# Altium integrated library WE_WR-WTB_Wire-to-Board Connectors_2.54 mm_rev16a.IntLib: 58 symbols
Pins are listed as number, name and electrical type; pins without a type are passive.

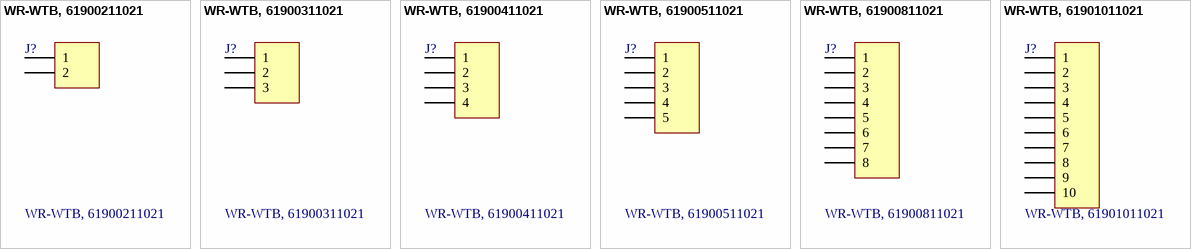
[diagram p0: symbols WR-WTB, 61900211021 to WR-WTB, 61901011021]

## WR-WTB, 61900211021
designator J?
WR-WTB 2.54mm Male Left Angeled Locking Header; Manufacturer: Würth Elektronik eiSos GmbH; ComponentLink1 Description: Manufacturer; ComponentLink2 Description: Datasheet; NoPins: 2; Created Date: 17 May 2013; partNo: 61900211021; ComponentLink1URL: http://www.we-online.com; ComponentLink2URL: http://katalog.we-online.de/em/datasheet/6190xx11021.pdf; Created by: Karrer Zheng
footprint 61900211021 (2 pins, left angeled)
pins: 1, 2

## WR-WTB, 61900311021
designator J?
WR-WTB 2.54mm Male Left Angeled Locking Header; Manufacturer: Würth Elektronik eiSos GmbH; ComponentLink1 Description: Manufacturer; ComponentLink2 Description: Datasheet; NoPins: 3; Created Date: 17 May 2013; partNo: 61900311021; ComponentLink1URL: http://www.we-online.com; ComponentLink2URL: http://katalog.we-online.de/em/datasheet/6190xx11021.pdf; Created by: Karrer Zheng
footprint 61900311021 (3 pins, left angeled)
pins: 1, 2, 3

## WR-WTB, 61900411021
designator J?
WR-WTB 2.54mm Male Left Angeled Locking Header; Manufacturer: Würth Elektronik eiSos GmbH; ComponentLink1 Description: Manufacturer; ComponentLink2 Description: Datasheet; NoPins: 4; Created Date: 17 May 2013; partNo: 61900411021; ComponentLink1URL: http://www.we-online.com; ComponentLink2URL: http://katalog.we-online.de/em/datasheet/6190xx11021.pdf; Created by: Karrer Zheng
footprint 61900411021 (4 pins, left angeled)
pins: 1, 2, 3, 4

## WR-WTB, 61900511021
designator J?
WR-WTB 2.54mm Male Left Angeled Locking Header; Manufacturer: Würth Elektronik eiSos GmbH; ComponentLink1 Description: Manufacturer; ComponentLink2 Description: Datasheet; NoPins: 5; Created Date: 17 May 2013; partNo: 61900511021; ComponentLink1URL: http://www.we-online.com; ComponentLink2URL: http://katalog.we-online.de/em/datasheet/6190xx11021.pdf; Created by: Karrer Zheng
footprint 61900511021 (5 pins, left angeled)
pins: 1, 2, 3, 4, 5

## WR-WTB, 61900811021
designator J?
WR-WTB 2.54mm Male Left Angeled Locking Header; Manufacturer: Würth Elektronik eiSos GmbH; ComponentLink1 Description: Manufacturer; ComponentLink2 Description: Datasheet; NoPins: 8; Created Date: 17 May 2013; partNo: 61900811021; ComponentLink1URL: http://www.we-online.com; ComponentLink2URL: http://katalog.we-online.de/em/datasheet/6190xx11021.pdf; Created by: Karrer Zheng
footprint 61900811021 (8 pins, left angeled)
pins: 1, 2, 3, 4, 5, 6, 7, 8

## WR-WTB, 61901011021
designator J?
WR-WTB 2.54mm Male Left Angeled Locking Header; Manufacturer: Würth Elektronik eiSos GmbH; ComponentLink1 Description: Manufacturer; ComponentLink2 Description: Datasheet; NoPins: 10; Created Date: 17 May 2013; partNo: 61901011021; ComponentLink1URL: http://www.we-online.com; ComponentLink2URL: http://katalog.we-online.de/em/datasheet/6190xx11021.pdf; Created by: Karrer Zheng
footprint 61901011021 (10 pins, left angeled)
pins: 1, 2, 3, 4, 5, 6, 7, 8, 9, 10


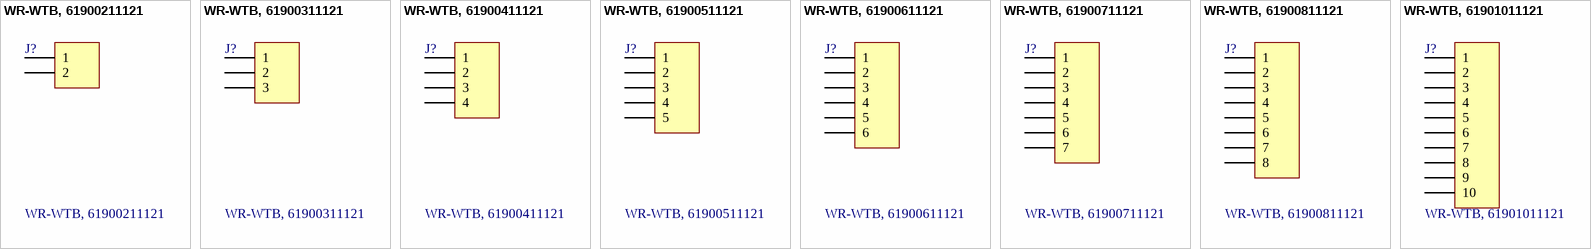
[diagram p1: symbols WR-WTB, 61900211121 to WR-WTB, 61901011121]

## WR-WTB, 61900211121
designator J?
WR-WTB 2.54mm Male Locking Header; Manufacturer: Würth Elektronik eiSos GmbH; ComponentLink1 Description: Manufacturer; ComponentLink2 Description: Datasheet; NoPins: 2; Created Date: 16 May 2013; partNo: 61900211121; ComponentLink1URL: http://www.we-online.com; ComponentLink2URL: http://katalog.we-online.de/em/datasheet/6190xx11121.pdf; Created by: Karrer Zheng
footprint 61900211121 (2 pins, straight)
pins: 1, 2

## WR-WTB, 61900311121
designator J?
WR-WTB 2.54mm Male Locking Header; Manufacturer: Würth Elektronik eiSos GmbH; ComponentLink1 Description: Manufacturer; ComponentLink2 Description: Datasheet; NoPins: 3; Created Date: 16 May 2013; partNo: 61900311121; ComponentLink1URL: http://www.we-online.com; ComponentLink2URL: http://katalog.we-online.de/em/datasheet/6190xx11121.pdf; Created by: Karrer Zheng
footprint 61900311121 (3 pins, straight)
pins: 1, 2, 3

## WR-WTB, 61900411121
designator J?
WR-WTB 2.54mm Male Locking Header; Manufacturer: Würth Elektronik eiSos GmbH; ComponentLink1 Description: Manufacturer; ComponentLink2 Description: Datasheet; NoPins: 4; Created Date: 16 May 2013; partNo: 61900411121; ComponentLink1URL: http://www.we-online.com; ComponentLink2URL: http://katalog.we-online.de/em/datasheet/6190xx11121.pdf; Created by: Karrer Zheng
footprint 61900411121 (4 pins, straight)
pins: 1, 2, 3, 4

## WR-WTB, 61900511121
designator J?
WR-WTB 2.54mm Male Locking Header; Manufacturer: Würth Elektronik eiSos GmbH; ComponentLink1 Description: Manufacturer; ComponentLink2 Description: Datasheet; NoPins: 5; Created Date: 16 May 2013; partNo: 61900511121; ComponentLink1URL: http://www.we-online.com; ComponentLink2URL: http://katalog.we-online.de/em/datasheet/6190xx11121.pdf; Created by: Karrer Zheng
footprint 61900511121 (5 pins, straight)
pins: 1, 2, 3, 4, 5

## WR-WTB, 61900611121
designator J?
WR-WTB 2.54mm Male Locking Header; Manufacturer: Würth Elektronik eiSos GmbH; ComponentLink1 Description: Manufacturer; ComponentLink2 Description: Datasheet; NoPins: 6; Created Date: 16 May 2013; partNo: 61900611121; ComponentLink1URL: http://www.we-online.com; ComponentLink2URL: http://katalog.we-online.de/em/datasheet/6190xx11121.pdf; Created by: Karrer Zheng
footprint 61900611121 (6 pins, straight)
pins: 1, 2, 3, 4, 5, 6

## WR-WTB, 61900711121
designator J?
WR-WTB 2.54mm Male Locking Header; Manufacturer: Würth Elektronik eiSos GmbH; ComponentLink1 Description: Manufacturer; ComponentLink2 Description: Datasheet; NoPins: 7; Created Date: 16 May 2013; partNo: 61900711121; ComponentLink1URL: http://www.we-online.com; ComponentLink2URL: http://katalog.we-online.de/em/datasheet/6190xx11121.pdf; Created by: Karrer Zheng
footprint 61900711121 (7 pins, straight)
pins: 1, 2, 3, 4, 5, 6, 7

## WR-WTB, 61900811121
designator J?
WR-WTB 2.54mm Male Locking Header; Manufacturer: Würth Elektronik eiSos GmbH; ComponentLink1 Description: Manufacturer; ComponentLink2 Description: Datasheet; NoPins: 8; Created Date: 16 May 2013; partNo: 61900811121; ComponentLink1URL: http://www.we-online.com; ComponentLink2URL: http://katalog.we-online.de/em/datasheet/6190xx11121.pdf; Created by: Karrer Zheng
footprint 61900811121 (8 pins, straight)
pins: 1, 2, 3, 4, 5, 6, 7, 8

## WR-WTB, 61901011121
designator J?
WR-WTB 2.54mm Male Locking Header; Manufacturer: Würth Elektronik eiSos GmbH; ComponentLink1 Description: Manufacturer; ComponentLink2 Description: Datasheet; NoPins: 10; Created Date: 16 May 2013; partNo: 61901011121; ComponentLink1URL: http://www.we-online.com; ComponentLink2URL: http://katalog.we-online.de/em/datasheet/6190xx11121.pdf; Created by: Karrer Zheng
footprint 61901011121 (10 pins, straight)
pins: 1, 2, 3, 4, 5, 6, 7, 8, 9, 10


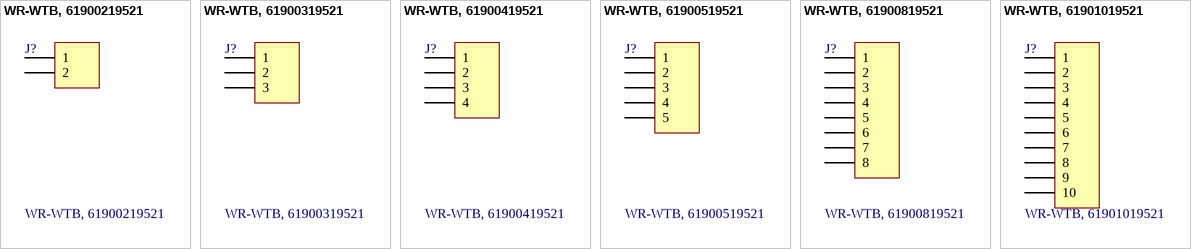
[diagram p2: symbols WR-WTB, 61900219521 to WR-WTB, 61901019521]

## WR-WTB, 61900219521
designator J?
WERI Wire to board 2,54; Manufacturer: Würth Elektronik eiSos GmbH; ComponentLink1 Description: Manufacturer; ComponentLink2 Description: Datasheet; NoPins: 2; Created Date: 17 May 2013; partNo: 61900219521; ComponentLink1URL: http://www.we-online.com; ComponentLink2URL: http://katalog.we-online.de/em/datasheet/6190xx19521.pdf; Created by: Karrer Zheng
footprint 61900219521 (M RA 2p 1 row left)
pins: 1, 2

## WR-WTB, 61900319521
designator J?
WERI Wire to board 2,54; Manufacturer: Würth Elektronik eiSos GmbH; ComponentLink1 Description: Manufacturer; ComponentLink2 Description: Datasheet; NoPins: 3; Created Date: 17 May 2013; partNo: 61900319521; ComponentLink1URL: http://www.we-online.com; ComponentLink2URL: http://katalog.we-online.de/em/datasheet/6190xx19521.pdf; Created by: Karrer Zheng
footprint 61900319521 (M RA 3p 1 row left)
pins: 1, 2, 3

## WR-WTB, 61900419521
designator J?
WERI Wire to board 2,54; Manufacturer: Würth Elektronik eiSos GmbH; ComponentLink1 Description: Manufacturer; ComponentLink2 Description: Datasheet; NoPins: 4; Created Date: 17 May 2013; partNo: 61900419521; ComponentLink1URL: http://www.we-online.com; ComponentLink2URL: http://katalog.we-online.de/em/datasheet/6190xx19521.pdf; Created by: Karrer Zheng
footprint 61900419521 (M RA 4p 1 row left)
pins: 1, 2, 3, 4

## WR-WTB, 61900519521
designator J?
WERI Wire to board 2,54; Manufacturer: Würth Elektronik eiSos GmbH; ComponentLink1 Description: Manufacturer; ComponentLink2 Description: Datasheet; NoPins: 5; Created Date: 17 May 2013; partNo: 61900519521; ComponentLink1URL: http://www.we-online.com; ComponentLink2URL: http://katalog.we-online.de/em/datasheet/6190xx19521.pdf; Created by: Karrer Zheng
footprint 61900519521 (M RA 5p 1 row left)
pins: 1, 2, 3, 4, 5

## WR-WTB, 61900819521
designator J?
WERI Wire to board 2,54; Manufacturer: Würth Elektronik eiSos GmbH; ComponentLink1 Description: Manufacturer; ComponentLink2 Description: Datasheet; NoPins: 8; Created Date: 17 May 2013; partNo: 61900819521; ComponentLink1URL: http://www.we-online.com; ComponentLink2URL: http://katalog.we-online.de/em/datasheet/6190xx19521.pdf; Created by: Karrer Zheng
footprint 61900819521 (M RA 8p 1 row left)
pins: 1, 2, 3, 4, 5, 6, 7, 8

## WR-WTB, 61901019521
designator J?
WERI Wire to board 2,54; Manufacturer: Würth Elektronik eiSos GmbH; ComponentLink1 Description: Manufacturer; ComponentLink2 Description: Datasheet; NoPins: 10; Created Date: 17 May 2013; partNo: 61901019521; ComponentLink1URL: http://www.we-online.com; ComponentLink2URL: http://katalog.we-online.de/em/datasheet/6190xx19521.pdf; Created by: Karrer Zheng
footprint 61901019521 (M RA 10p 1 row left)
pins: 1, 2, 3, 4, 5, 6, 7, 8, 9, 10


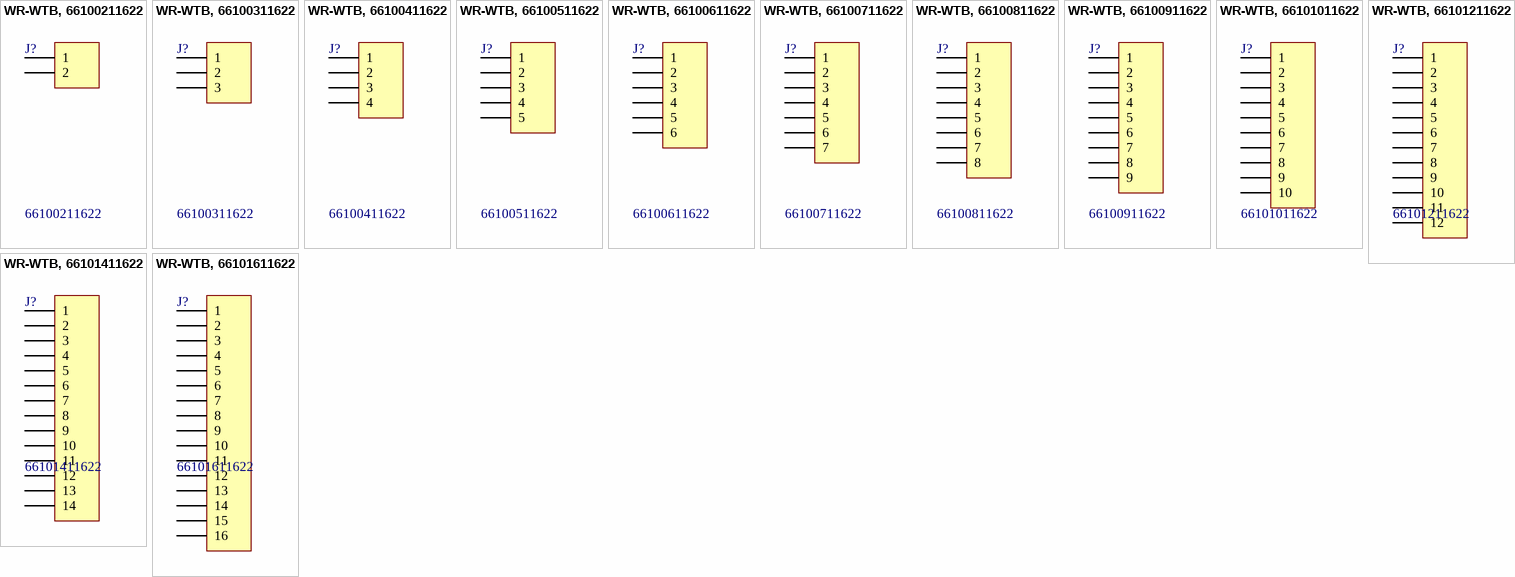
[diagram p3: symbols WR-WTB, 66100211622 to WR-WTB, 66101611622]

## WR-WTB, 66100211622
designator J?, comment 66100211622
WR-WTB 2.54mm Shrouded Header_Straight; Manufacturer: Wurth Elektronik; ComponentLink1 Description: Manufacturer; ComponentLink2 Description: Datasheet; NoPins: 2; Created Date: 21.Sep.2015; partNo: 66100211622; ComponentLink1URL: http://www.we-online.com; ComponentLink2URL: http://katalog.we-online.de/em/datasheet/6610XX11622.pdf; Created by: Baojun Chen
footprint 66100211622 (2 pins, Straight)
pins: 1, 2

## WR-WTB, 66100311622
designator J?, comment 66100311622
WR-WTB 2.54mm Shrouded Header_Straight; Manufacturer: Wurth Elektronik; ComponentLink1 Description: Manufacturer; ComponentLink2 Description: Datasheet; NoPins: 3; Created Date: 21.Sep.2015; partNo: 66100311622; ComponentLink1URL: http://www.we-online.com; ComponentLink2URL: http://katalog.we-online.de/em/datasheet/6610XX11622.pdf; Created by: Baojun Chen
footprint 66100311622 (3 pins, Straight)
pins: 1, 2, 3

## WR-WTB, 66100411622
designator J?, comment 66100411622
WR-WTB 2.54mm Shrouded Header_Straight; Manufacturer: Wurth Elektronik; ComponentLink1 Description: Manufacturer; ComponentLink2 Description: Datasheet; NoPins: 4; Created Date: 21.Sep.2015; partNo: 66100411622; ComponentLink1URL: http://www.we-online.com; ComponentLink2URL: http://katalog.we-online.de/em/datasheet/6610XX11622.pdf; Created by: Baojun Chen
footprint 66100411622 (4 pins, Straight)
pins: 1, 2, 3, 4

## WR-WTB, 66100511622
designator J?, comment 66100511622
WR-WTB 2.54mm Shrouded Header_Straight; Manufacturer: Wurth Elektronik; ComponentLink1 Description: Manufacturer; ComponentLink2 Description: Datasheet; NoPins: 5; Created Date: 21.Sep.2015; partNo: 66100511622; ComponentLink1URL: http://www.we-online.com; ComponentLink2URL: http://katalog.we-online.de/em/datasheet/6610XX11622.pdf; Created by: Baojun Chen
footprint 66100511622 (5 pins, Straight)
pins: 1, 2, 3, 4, 5

## WR-WTB, 66100611622
designator J?, comment 66100611622
WR-WTB 2.54mm Shrouded Header_Straight; Manufacturer: Wurth Elektronik; ComponentLink1 Description: Manufacturer; ComponentLink2 Description: Datasheet; NoPins: 6; Created Date: 21.Sep.2015; partNo: 66100611622; ComponentLink1URL: http://www.we-online.com; ComponentLink2URL: http://katalog.we-online.de/em/datasheet/6610XX11622.pdf; Created by: Baojun Chen
footprint 66100611622 (6 pins, Straight)
pins: 1, 2, 3, 4, 5, 6

## WR-WTB, 66100711622
designator J?, comment 66100711622
WR-WTB 2.54mm Shrouded Header_Straight; Manufacturer: Wurth Elektronik; ComponentLink1 Description: Manufacturer; ComponentLink2 Description: Datasheet; NoPins: 7; Created Date: 21.Sep.2015; partNo: 66100711622; ComponentLink1URL: http://www.we-online.com; ComponentLink2URL: http://katalog.we-online.de/em/datasheet/6610XX11622.pdf; Created by: Baojun Chen
footprint 66100711622 (7 pins, Straight)
pins: 1, 2, 3, 4, 5, 6, 7

## WR-WTB, 66100811622
designator J?, comment 66100811622
WR-WTB 2.54mm Shrouded Header_Straight; Manufacturer: Wurth Elektronik; ComponentLink1 Description: Manufacturer; ComponentLink2 Description: Datasheet; NoPins: 8; Created Date: 21.Sep.2015; partNo: 66100811622; ComponentLink1URL: http://www.we-online.com; ComponentLink2URL: http://katalog.we-online.de/em/datasheet/6610XX11622.pdf; Created by: Baojun Chen
footprint 66100811622 (8 pins, Straight)
pins: 1, 2, 3, 4, 5, 6, 7, 8

## WR-WTB, 66100911622
designator J?, comment 66100911622
WR-WTB 2.54mm Shrouded Header_Straight; Manufacturer: Wurth Elektronik; ComponentLink1 Description: Manufacturer; ComponentLink2 Description: Datasheet; NoPins: 9; Created Date: 21.Sep.2015; partNo: 66100911622; ComponentLink1URL: http://www.we-online.com; ComponentLink2URL: http://katalog.we-online.de/em/datasheet/6610XX11622.pdf; Created by: Baojun Chen
footprint 66100911622 (9 pins, Straight)
pins: 1, 2, 3, 4, 5, 6, 7, 8, 9

## WR-WTB, 66101011622
designator J?, comment 66101011622
WR-WTB 2.54mm Shrouded Header_Straight; Manufacturer: Wurth Elektronik; ComponentLink1 Description: Manufacturer; ComponentLink2 Description: Datasheet; NoPins: 10; Created Date: 21.Sep.2015; partNo: 66101011622; ComponentLink1URL: http://www.we-online.com; ComponentLink2URL: http://katalog.we-online.de/em/datasheet/6610XX11622.pdf; Created by: Baojun Chen
footprint 66101011622 (10 pins, Straight)
pins: 1, 2, 3, 4, 5, 6, 7, 8, 9, 10

## WR-WTB, 66101211622
designator J?, comment 66101211622
WR-WTB 2.54mm Shrouded Header_Straight; Manufacturer: Wurth Elektronik; ComponentLink1 Description: Manufacturer; ComponentLink2 Description: Datasheet; NoPins: 12; Created Date: 21.Sep.2015; partNo: 66101211622; ComponentLink1URL: http://www.we-online.com; ComponentLink2URL: http://katalog.we-online.de/em/datasheet/6610XX11622.pdf; Created by: Baojun Chen
footprint 66101211622 (12 pins, Straight)
pins: 1, 2, 3, 4, 5, 6, 7, 8, 9, 10, 11, 12

## WR-WTB, 66101411622
designator J?, comment 66101411622
WR-WTB 2.54mm Shrouded Header_Straight; Manufacturer: Wurth Elektronik; ComponentLink1 Description: Manufacturer; ComponentLink2 Description: Datasheet; NoPins: 14; Created Date: 21.Sep.2015; partNo: 66101411622; ComponentLink1URL: http://www.we-online.com; ComponentLink2URL: http://katalog.we-online.de/em/datasheet/6610XX11622.pdf; Created by: Baojun Chen
footprint 66101411622 (14 pins, Straight)
pins: 1, 2, 3, 4, 5, 6, 7, 8, 9, 10, 11, 12, 13, 14

## WR-WTB, 66101611622
designator J?, comment 66101611622
WR-WTB 2.54mm Shrouded Header_Straight; Manufacturer: Wurth Elektronik; ComponentLink1 Description: Manufacturer; ComponentLink2 Description: Datasheet; NoPins: 16; Created Date: 21.Sep.2015; partNo: 66101611622; ComponentLink1URL: http://www.we-online.com; ComponentLink2URL: http://katalog.we-online.de/em/datasheet/6610XX11622.pdf; Created by: Baojun Chen
footprint 66101611622 (16 pins, Straight)
pins: 1, 2, 3, 4, 5, 6, 7, 8, 9, 10, 11, 12, 13, 14, 15, 16


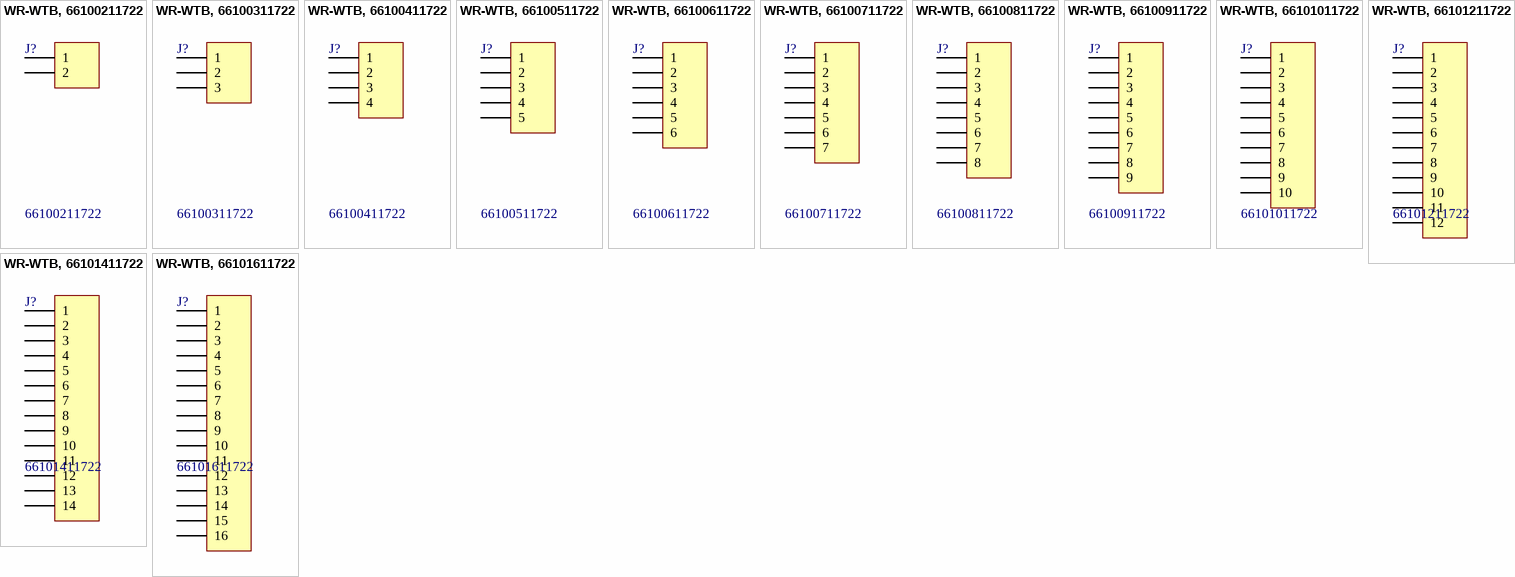
[diagram p4: symbols WR-WTB, 66100211722 to WR-WTB, 66101611722]

## WR-WTB, 66100211722
designator J?, comment 66100211722
WR-WTB 2.54mm Shrouded Header_Right Angle; Manufacturer: Wurth Elektronik; ComponentLink1 Description: Manufacturer; ComponentLink2 Description: Datasheet; NoPins: 2; Created Date: 9.Oct.2015; partNo: 66100211722; ComponentLink1URL: http://www.we-online.com; ComponentLink2URL: http://katalog.we-online.de/en/em/WTB_2_54_MALE_VERTICAL_SHROUDED_HEADER_GLOW_WIRE_PLASTIC_6610XXX1722; Created by: Baojun Chen
footprint 66100211722 (2 pins, Right Angle)
pins: 1, 2

## WR-WTB, 66100311722
designator J?, comment 66100311722
WR-WTB 2.54mm Shrouded Header_Right Angle; Manufacturer: Wurth Elektronik; ComponentLink1 Description: Manufacturer; ComponentLink2 Description: Datasheet; NoPins: 3; Created Date: 9.Oct.2015; partNo: 66100311722; ComponentLink1URL: http://www.we-online.com; ComponentLink2URL: http://katalog.we-online.de/en/em/WTB_2_54_MALE_VERTICAL_SHROUDED_HEADER_GLOW_WIRE_PLASTIC_6610XXX1722; Created by: Baojun Chen
footprint 66100311722 (3 pins, Right Angle)
pins: 1, 2, 3

## WR-WTB, 66100411722
designator J?, comment 66100411722
WR-WTB 2.54mm Shrouded Header_Right Angle; Manufacturer: Wurth Elektronik; ComponentLink1 Description: Manufacturer; ComponentLink2 Description: Datasheet; NoPins: 4; Created Date: 9.Oct.2015; partNo: 66100411722; ComponentLink1URL: http://www.we-online.com; ComponentLink2URL: http://katalog.we-online.de/en/em/WTB_2_54_MALE_VERTICAL_SHROUDED_HEADER_GLOW_WIRE_PLASTIC_6610XXX1722; Created by: Baojun Chen
footprint 66100411722 (4 pins, Right Angle)
pins: 1, 2, 3, 4

## WR-WTB, 66100511722
designator J?, comment 66100511722
WR-WTB 2.54mm Shrouded Header_Right Angle; Manufacturer: Wurth Elektronik; ComponentLink1 Description: Manufacturer; ComponentLink2 Description: Datasheet; NoPins: 5; Created Date: 9.Oct.2015; partNo: 66100511722; ComponentLink1URL: http://www.we-online.com; ComponentLink2URL: http://katalog.we-online.de/en/em/WTB_2_54_MALE_VERTICAL_SHROUDED_HEADER_GLOW_WIRE_PLASTIC_6610XXX1722; Created by: Baojun Chen
footprint 66100511722 (5 pins, Right Angle)
pins: 1, 2, 3, 4, 5

## WR-WTB, 66100611722
designator J?, comment 66100611722
WR-WTB 2.54mm Shrouded Header_Right Angle; Manufacturer: Wurth Elektronik; ComponentLink1 Description: Manufacturer; ComponentLink2 Description: Datasheet; NoPins: 6; Created Date: 9.Oct.2015; partNo: 66100611722; ComponentLink1URL: http://www.we-online.com; ComponentLink2URL: http://katalog.we-online.de/en/em/WTB_2_54_MALE_VERTICAL_SHROUDED_HEADER_GLOW_WIRE_PLASTIC_6610XXX1722; Created by: Baojun Chen
footprint 66100611722 (6 pins, Right Angle)
pins: 1, 2, 3, 4, 5, 6

## WR-WTB, 66100711722
designator J?, comment 66100711722
WR-WTB 2.54mm Shrouded Header_Right Angle; Manufacturer: Wurth Elektronik; ComponentLink1 Description: Manufacturer; ComponentLink2 Description: Datasheet; NoPins: 7; Created Date: 9.Oct.2015; partNo: 66100711722; ComponentLink1URL: http://www.we-online.com; ComponentLink2URL: http://katalog.we-online.de/en/em/WTB_2_54_MALE_VERTICAL_SHROUDED_HEADER_GLOW_WIRE_PLASTIC_6610XXX1722; Created by: Baojun Chen
footprint 66100711722 (7 pins, Right Angle)
pins: 1, 2, 3, 4, 5, 6, 7

## WR-WTB, 66100811722
designator J?, comment 66100811722
WR-WTB 2.54mm Shrouded Header_Right Angle; Manufacturer: Wurth Elektronik; ComponentLink1 Description: Manufacturer; ComponentLink2 Description: Datasheet; NoPins: 8; Created Date: 9.Oct.2015; partNo: 66100811722; ComponentLink1URL: http://www.we-online.com; ComponentLink2URL: http://katalog.we-online.de/en/em/WTB_2_54_MALE_VERTICAL_SHROUDED_HEADER_GLOW_WIRE_PLASTIC_6610XXX1722; Created by: Baojun Chen
footprint 66100811722 (8 pins, Right Angle)
pins: 1, 2, 3, 4, 5, 6, 7, 8

## WR-WTB, 66100911722
designator J?, comment 66100911722
WR-WTB 2.54mm Shrouded Header_Right Angle; Manufacturer: Wurth Elektronik; ComponentLink1 Description: Manufacturer; ComponentLink2 Description: Datasheet; NoPins: 9; Created Date: 9.Oct.2015; partNo: 66100911722; ComponentLink1URL: http://www.we-online.com; ComponentLink2URL: http://katalog.we-online.de/en/em/WTB_2_54_MALE_VERTICAL_SHROUDED_HEADER_GLOW_WIRE_PLASTIC_6610XXX1722; Created by: Baojun Chen
footprint 66100911722 (9 pins, Right Angle)
pins: 1, 2, 3, 4, 5, 6, 7, 8, 9

## WR-WTB, 66101011722
designator J?, comment 66101011722
WR-WTB 2.54mm Shrouded Header_Right Angle; Manufacturer: Wurth Elektronik; ComponentLink1 Description: Manufacturer; ComponentLink2 Description: Datasheet; NoPins: 10; Created Date: 9.Oct.2015; partNo: 66101011722; ComponentLink1URL: http://www.we-online.com; ComponentLink2URL: http://katalog.we-online.de/en/em/WTB_2_54_MALE_VERTICAL_SHROUDED_HEADER_GLOW_WIRE_PLASTIC_6610XXX1722; Created by: Baojun Chen
footprint 66101011722 (10 pins, Right Angle)
pins: 1, 2, 3, 4, 5, 6, 7, 8, 9, 10

## WR-WTB, 66101211722
designator J?, comment 66101211722
WR-WTB 2.54mm Shrouded Header_Right Angle; Manufacturer: Wurth Elektronik; ComponentLink1 Description: Manufacturer; ComponentLink2 Description: Datasheet; NoPins: 12; Created Date: 9.Oct.2015; partNo: 66101211722; ComponentLink1URL: http://www.we-online.com; ComponentLink2URL: http://katalog.we-online.de/en/em/WTB_2_54_MALE_VERTICAL_SHROUDED_HEADER_GLOW_WIRE_PLASTIC_6610XXX1722; Created by: Baojun Chen
footprint 66101211722 (12 pins, Right Angle)
pins: 1, 2, 3, 4, 5, 6, 7, 8, 9, 10, 11, 12

## WR-WTB, 66101411722
designator J?, comment 66101411722
WR-WTB 2.54mm Shrouded Header_Right Angle; Manufacturer: Wurth Elektronik; ComponentLink1 Description: Manufacturer; ComponentLink2 Description: Datasheet; NoPins: 14; Created Date: 9.Oct.2015; partNo: 66101411722; ComponentLink1URL: http://www.we-online.com; ComponentLink2URL: http://katalog.we-online.de/en/em/WTB_2_54_MALE_VERTICAL_SHROUDED_HEADER_GLOW_WIRE_PLASTIC_6610XXX1722; Created by: Baojun Chen
footprint 66101411722 (14 pins, Right Angle)
pins: 1, 2, 3, 4, 5, 6, 7, 8, 9, 10, 11, 12, 13, 14

## WR-WTB, 66101611722
designator J?, comment 66101611722
WR-WTB 2.54mm Shrouded Header_Right Angle; Manufacturer: Wurth Elektronik; ComponentLink1 Description: Manufacturer; ComponentLink2 Description: Datasheet; NoPins: 16; Created Date: Dec.2015; partNo: 66101611722; ComponentLink1URL: http://www.we-online.com; ComponentLink2URL: http://katalog.we-online.de/en/em/WTB_2_54_MALE_VERTICAL_SHROUDED_HEADER_GLOW_WIRE_PLASTIC_6610XXX1722; Created by: Baojun Chen
footprint 66101611722 (16 pins, Right Angle)
pins: 1, 2, 3, 4, 5, 6, 7, 8, 9, 10, 11, 12, 13, 14, 15, 16


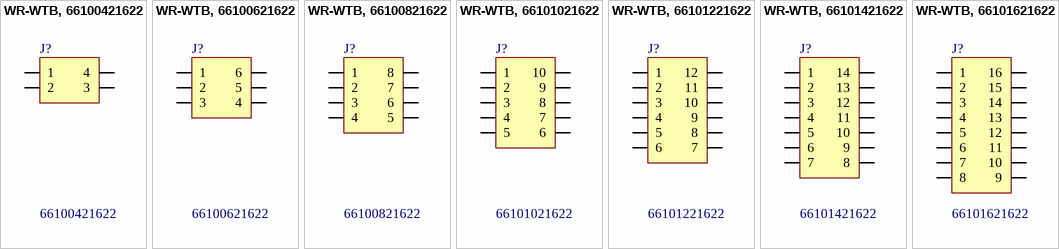
[diagram p5: symbols WR-WTB, 66100421622 to WR-WTB, 66101621622]

## WR-WTB, 66100421622
designator J?, comment 66100421622
WR-WTB 2.54mm Shrouded Header_Straight; Manufacturer: Wurth Elektronik; ComponentLink1 Description: Manufacturer; ComponentLink2 Description: Datasheet; NoPins: 4; Created Date: 9.Oct.2015; partNo: 66100421622; ComponentLink1URL: http://www.we-online.com; ComponentLink2URL: http://katalog.we-online.de/em/datasheet/6610XX11622.pdf; Created by: Baojun Chen
footprint 66100421622 (4 pins)
pins: 1, 2, 3, 4

## WR-WTB, 66100621622
designator J?, comment 66100621622
WR-WTB 2.54mm Shrouded Header_Straight; Manufacturer: Wurth Elektronik; ComponentLink1 Description: Manufacturer; ComponentLink2 Description: Datasheet; NoPins: 6; Created Date: 9.Oct.2015; partNo: 66100621622; ComponentLink1URL: http://www.we-online.com; ComponentLink2URL: http://katalog.we-online.de/em/datasheet/6610XX11622.pdf; Created by: Baojun Chen
footprint 66100621622 (6 pins)
pins: 1, 2, 3, 4, 5, 6

## WR-WTB, 66100821622
designator J?, comment 66100821622
WR-WTB 2.54mm Shrouded Header_Straight; Manufacturer: Wurth Elektronik; ComponentLink1 Description: Manufacturer; ComponentLink2 Description: Datasheet; NoPins: 8; Created Date: 9.Oct.2015; partNo: 66100821622; ComponentLink1URL: http://www.we-online.com; ComponentLink2URL: http://katalog.we-online.de/em/datasheet/6610XX11622.pdf; Created by: Baojun Chen
footprint 66100821622 (8 pins)
pins: 1, 2, 3, 4, 5, 6, 7, 8

## WR-WTB, 66101021622
designator J?, comment 66101021622
WR-WTB 2.54mm Shrouded Header_Straight; Manufacturer: Wurth Elektronik; ComponentLink1 Description: Manufacturer; ComponentLink2 Description: Datasheet; NoPins: 10; Created Date: 9.Oct.2015; partNo: 66101021622; ComponentLink1URL: http://www.we-online.com; ComponentLink2URL: http://katalog.we-online.de/em/datasheet/6610XX11622.pdf; Created by: Baojun Chen
footprint 66101021622 (10 pins)
pins: 1, 2, 3, 4, 5, 6, 7, 8, 9, 10

## WR-WTB, 66101221622
designator J?, comment 66101221622
WR-WTB 2.54mm Shrouded Header_Straight; Manufacturer: Wurth Elektronik; ComponentLink1 Description: Manufacturer; ComponentLink2 Description: Datasheet; NoPins: 12; Created Date: 9.Oct.2015; partNo: 66101221622; ComponentLink1URL: http://www.we-online.com; ComponentLink2URL: http://katalog.we-online.de/em/datasheet/6610XX11622.pdf; Created by: Baojun Chen
footprint 66101221622 (12 pins)
pins: 1, 2, 3, 4, 5, 6, 7, 8, 9, 10, 11, 12

## WR-WTB, 66101421622
designator J?, comment 66101421622
WR-WTB 2.54mm Shrouded Header_Straight; Manufacturer: Wurth Elektronik; ComponentLink1 Description: Manufacturer; ComponentLink2 Description: Datasheet; NoPins: 14; Created Date: 9.Oct.2015; partNo: 66101421622; ComponentLink1URL: http://www.we-online.com; ComponentLink2URL: http://katalog.we-online.de/em/datasheet/6610XX11622.pdf; Created by: Baojun Chen
footprint 66101421622 (14 pins)
pins: 1, 2, 3, 4, 5, 6, 7, 8, 9, 10, 11, 12, 13, 14

## WR-WTB, 66101621622
designator J?, comment 66101621622
WR-WTB 2.54mm Shrouded Header_Straight; Manufacturer: Wurth Elektronik; ComponentLink1 Description: Manufacturer; ComponentLink2 Description: Datasheet; NoPins: 16; Created Date: 9.Oct.2015; partNo: 66101621622; ComponentLink1URL: http://www.we-online.com; ComponentLink2URL: http://katalog.we-online.de/em/datasheet/6610XX11622.pdf; Created by: Baojun Chen
footprint 66101621622 (16 pins)
pins: 1, 2, 3, 4, 5, 6, 7, 8, 9, 10, 11, 12, 13, 14, 15, 16


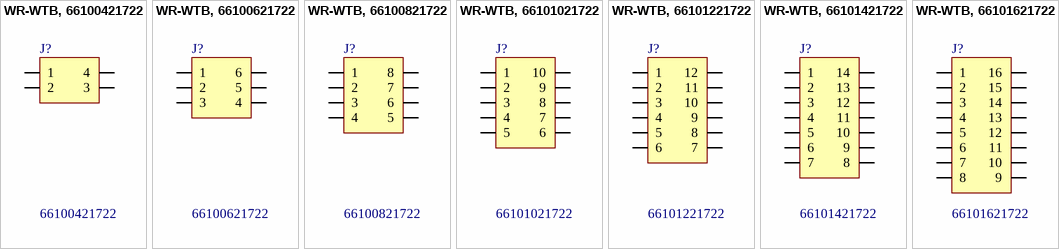
[diagram p6: symbols WR-WTB, 66100421722 to WR-WTB, 66101621722]

## WR-WTB, 66100421722
designator J?, comment 66100421722
WR-WTB 2.54mm Shrouded Header_Right Angle; Manufacturer: Wurth Elektronik; ComponentLink1 Description: Manufacturer; ComponentLink2 Description: Datasheet; NoPins: 4; Created Date: 10.Oct.2015; partNo: 66100421722; ComponentLink1URL: http://www.we-online.com; ComponentLink2URL: http://katalog.we-online.de/em/datasheet/6610XX21722.pdf; Created by: Baojun Chen
footprint 66100421722 (4 pins, Right Angle)
pins: 1, 2, 3, 4

## WR-WTB, 66100621722
designator J?, comment 66100621722
WR-WTB 2.54mm Shrouded Header_Right Angle; Manufacturer: Wurth Elektronik; ComponentLink1 Description: Manufacturer; ComponentLink2 Description: Datasheet; NoPins: 6; Created Date: 10.Oct.2015; partNo: 66100621722; ComponentLink1URL: http://www.we-online.com; ComponentLink2URL: http://katalog.we-online.de/em/datasheet/6610XX21722.pdf; Created by: Baojun Chen
footprint 66100621722 (6 pins, Right Angle)
pins: 1, 2, 3, 4, 5, 6

## WR-WTB, 66100821722
designator J?, comment 66100821722
WR-WTB 2.54mm Shrouded Header_Right Angle; Manufacturer: Wurth Elektronik; ComponentLink1 Description: Manufacturer; ComponentLink2 Description: Datasheet; NoPins: 8; Created Date: 10.Oct.2015; partNo: 66100821722; ComponentLink1URL: http://www.we-online.com; ComponentLink2URL: http://katalog.we-online.de/em/datasheet/6610XX21722.pdf; Created by: Baojun Chen
footprint 66100821722 (8 pins, Right Angle)
pins: 1, 2, 3, 4, 5, 6, 7, 8

## WR-WTB, 66101021722
designator J?, comment 66101021722
WR-WTB 2.54mm Shrouded Header_Right Angle; Manufacturer: Wurth Elektronik; ComponentLink1 Description: Manufacturer; ComponentLink2 Description: Datasheet; NoPins: 10; Created Date: 10.Oct.2015; partNo: 66101021722; ComponentLink1URL: http://www.we-online.com; ComponentLink2URL: http://katalog.we-online.de/em/datasheet/6610XX21722.pdf; Created by: Baojun Chen
footprint 66101021722 (10 pins, Right Angle)
pins: 1, 2, 3, 4, 5, 6, 7, 8, 9, 10

## WR-WTB, 66101221722
designator J?, comment 66101221722
WR-WTB 2.54mm Shrouded Header_Right Angle; Manufacturer: Wurth Elektronik; ComponentLink1 Description: Manufacturer; ComponentLink2 Description: Datasheet; NoPins: 12; Created Date: 10.Oct.2015; partNo: 66101221722; ComponentLink1URL: http://www.we-online.com; ComponentLink2URL: http://katalog.we-online.de/em/datasheet/6610XX21722.pdf; Created by: Baojun Chen
footprint 66101221722 (12 pins, Right Angle)
pins: 1, 2, 3, 4, 5, 6, 7, 8, 9, 10, 11, 12

## WR-WTB, 66101421722
designator J?, comment 66101421722
WR-WTB 2.54mm Shrouded Header_Right Angle; Manufacturer: Wurth Elektronik; ComponentLink1 Description: Manufacturer; ComponentLink2 Description: Datasheet; NoPins: 14; Created Date: 10.Oct.2015; partNo: 66101421722; ComponentLink1URL: http://www.we-online.com; ComponentLink2URL: http://katalog.we-online.de/em/datasheet/6610XX21722.pdf; Created by: Baojun Chen
footprint 66101421722 (14 pins, Right Angle)
pins: 1, 2, 3, 4, 5, 6, 7, 8, 9, 10, 11, 12, 13, 14

## WR-WTB, 66101621722
designator J?, comment 66101621722
WR-WTB 2.54mm Shrouded Header_Right Angle; Manufacturer: Wurth Elektronik; ComponentLink1 Description: Manufacturer; ComponentLink2 Description: Datasheet; NoPins: 16; Created Date: 10.Oct.2015; partNo: 66101621722; ComponentLink1URL: http://www.we-online.com; ComponentLink2URL: http://katalog.we-online.de/em/datasheet/6610XX21722.pdf; Created by: Baojun Chen
footprint 66101621722 (16 pins, Right Angle)
pins: 1, 2, 3, 4, 5, 6, 7, 8, 9, 10, 11, 12, 13, 14, 15, 16